# Altium footprint library USB Connectors WR-COM.PcbLib: 43 footprints (part 3 of 3)
Each footprint in its own frame and in the unit in brackets; x right, y up, seen from the top. Pads: shape width x height; smd on the part's side, far side on the other; paste and mask are expansions set on the pad; w line width, h text height; cw(c..) or ccw(c..) is an arc to the next point about the centre after c.
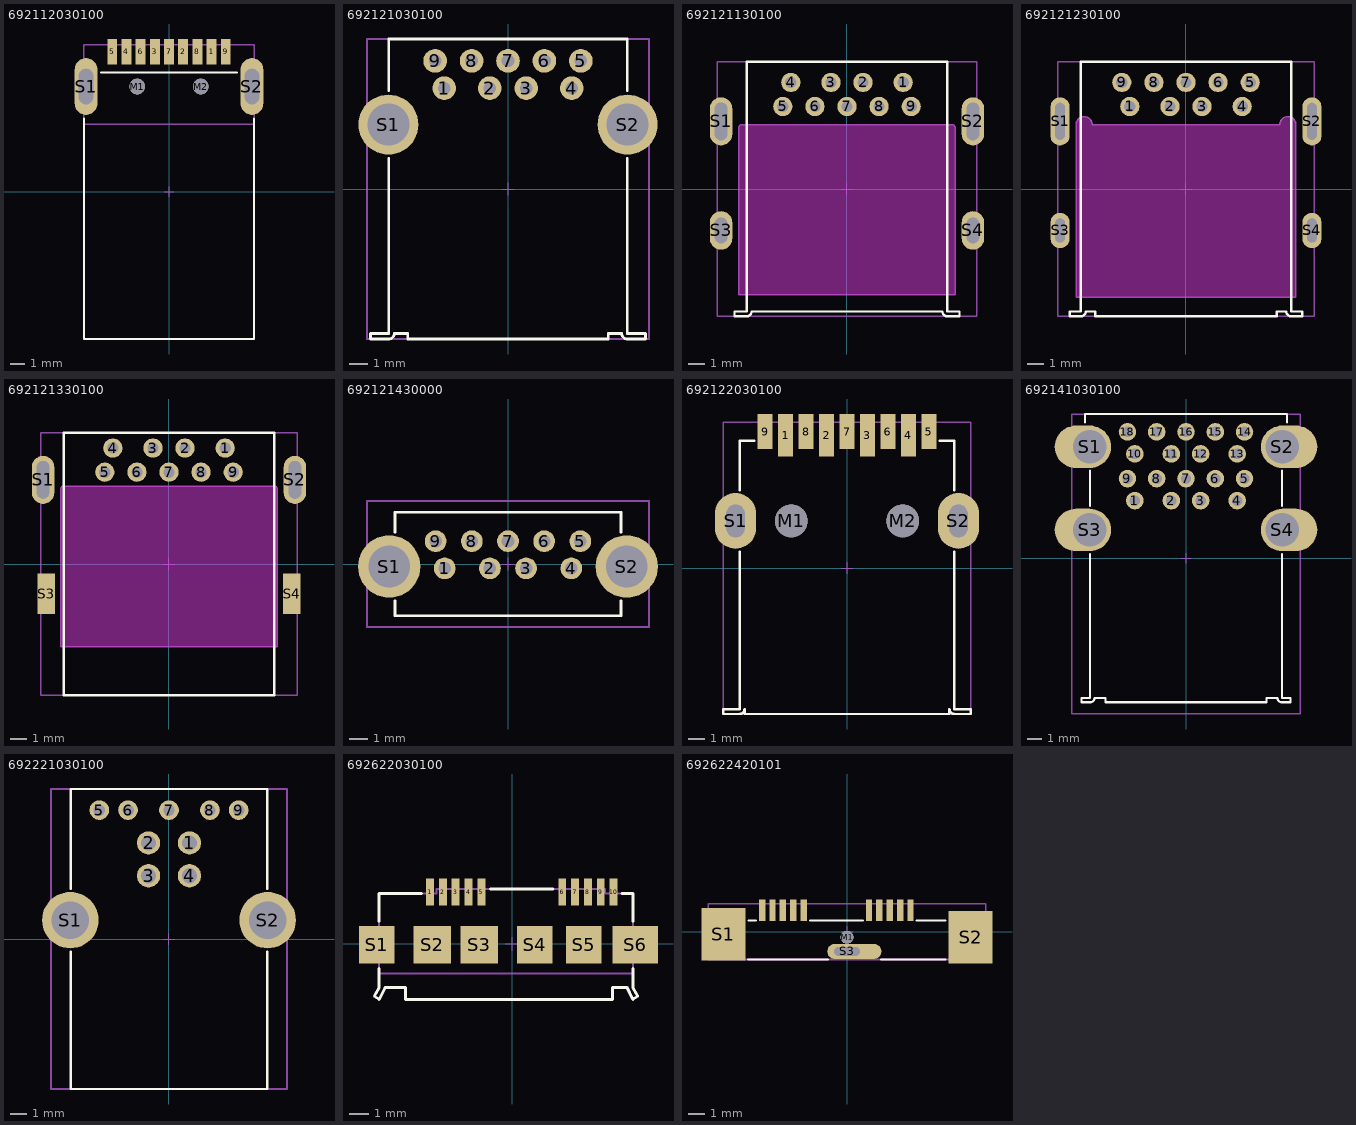
[diagram p2: the footprints below, top view; thin cyan lines are the x and y axes]

## 692112030100 [mm] "USB 3.0 Type A SMT Plug with Clip"
height 4.5
pads (13):
  rect 0.7x1.8 smd: 1(3,9.875) 2(1,9.875) 3(-1,9.875) 4(-3,9.875) 5(-4,9.875) 6(-2,9.875) 7(0,9.875) 8(2,9.875) 9(4,9.875)
  round 1.1 hole 1.1 unplated: M1(-2.25,7.425) M2(2.25,7.425)
  oval 1.6x4 hole 1 slot 2.5 at 90 deg: S1(-5.85,7.425) S2(5.85,7.425)
Top Overlay:
  lines w0.15: -6,5.15 -6,-10.375 6,-10.375 6,5.15 ; -4.8,8.425 4.8,8.425
Mechanical 1:
  lines w0.1: -6,4.775 6,4.775
  text "PCB Edge" at -2,3.725 h1
Mechanical 13:
  lines w0.1: -6,-10.375 6,-10.375 6,10.375 -6,10.375 -6,-10.375
Mechanical 15:
  lines w0.05: -0.35,0 0.35,0 ; 0,-0.35 0,0.35
3D body "692112030100.stp": height 1.85, standoff -2.65, extent -6,-10.375 6,10.375

## 692121030100 [mm] "USB 3.0 Type A Horizontal"
height 6.99
pads (11):
  round 1.3 hole 0.7: 1(-3.5,5.54) 2(-1,5.54) 3(1,5.54) 4(3.5,5.54) 5(4,7.04) 6(2,7.04) 7(0,7.04) 8(-2,7.04) 9(-4,7.04)
  round 3.3 hole 2.3: S1(-6.57,3.54) S2(6.57,3.54)
Top Overlay:
  lines w0.15: -6.55,1.69 -6.55,-7.94 -7.55,-7.94 -7.55,-8.24 -6.56,-8.24 ccw(c-6.55,-7.94) -6.25,-7.94 -5.5,-7.94 -5.5,-8.24 5.5,-8.24 5.5,-7.94 6.25,-7.94 ccw(c6.55,-7.94) 6.56,-8.24 7.55,-8.24 7.55,-7.94 6.55,-7.94 6.55,1.69 ; -6.55,5.39 -6.55,8.24 6.55,8.24 6.55,5.39
Mechanical 13:
  lines w0.1: -7.74,-8.24 7.74,-8.24 7.74,8.24 -7.74,8.24 -7.74,-8.24
Mechanical 15:
  lines w0.05: -0.35,0 0.35,0 ; 0,-0.35 0,0.35
3D body "692121030100.stp": height 8.02, standoff -3.2, extent -7.74,-8.24 7.74,8.31

## 692121130100 [mm] "USB 3.0 Type A Reverse Horizontal w. Offset 0.14mm"
height 5.12
pads (13):
  round 1.2 hole 0.7: 1(3.5,6.645) 2(1,6.645) 3(-1,6.645) 4(-3.5,6.645) 5(-4,5.145) 6(-2,5.145) 7(0,5.145) 8(2,5.145) 9(4,5.145)
  oval 1.4x3 hole 0.8 slot 2.35 at 90 deg: S1(-7.85,4.215) S2(7.85,4.215)
  oval 1.4x2.4 hole 0.8 slot 1.6 at 90 deg: S3(-7.85,-2.585) S4(7.85,-2.585)
Top Overlay:
  lines w0.15: -7.01,-7.935 -7.01,-7.635 -6.25,-7.635 -6.25,7.935 6.25,7.935 6.25,-7.635 7.01,-7.635 7.01,-7.935 6.26,-7.935 cw(c6.25,-7.635) 5.95,-7.635 -5.95,-7.635 cw(c-6.25,-7.635) -6.26,-7.935 -7.01,-7.935
Keep-Out Layer:
  board cut-out: -6.75,-6.585 6.75,-6.585 6.75,3.815 6.75,3.855 6.72,3.928 6.663,3.985 6.59,4.015 6.55,4.015 -6.55,4.015 -6.59,4.015 -6.663,3.985 -6.72,3.928 -6.75,3.855 -6.75,3.815
Mechanical 1:
  lines w0.1: -6.75,-6.585 -6.75,3.815 cw(c-6.55,3.815) -6.55,4.015 6.55,4.015 cw(c6.55,3.815) 6.75,3.815 6.75,-6.585 -6.75,-6.585
  text "PCB Cutout Area" at -5,-1.57 h1.5
Mechanical 13:
  lines w0.1: -8.078,-7.935 -8.078,7.935 8.078,7.935 8.078,-7.935 -8.078,-7.935
Mechanical 15:
  lines w0.05: -0.35,0 0.35,0 ; 0,-0.35 0,0.35
3D body "692121130100.stp": height 4.05, standoff -3.67, extent -8.078,-7.935 8.078,7.935

## 692121230100 [mm] "USB 3.0 Type A Horizontal with Offset 1.04mm"
height 3.9
pads (13):
  round 1.2 hole 0.7: 1(-3.5,5.145) 2(-1,5.145) 3(1,5.145) 4(3.5,5.145) 5(4,6.645) 6(2,6.645) 7(0,6.645) 8(-2,6.645) 9(-4,6.645)
  oval 1.2x3 hole 0.6 slot 2.3 at 90 deg: S1(-7.85,4.215) S2(7.85,4.215)
  oval 1.2x2.2 hole 0.6 slot 1.5 at 90 deg: S3(-7.85,-2.585) S4(7.85,-2.585)
Top Overlay:
  lines w0.15: -7.25,-7.935 -7.25,-7.635 -6.55,-7.635 -6.55,7.935 6.55,7.935 6.55,-7.635 7.25,-7.635 7.25,-7.935 6.56,-7.935 cw(c6.55,-7.635) 6.25,-7.635 5.65,-7.635 5.65,-7.935 -5.65,-7.935 -5.65,-7.635 -6.25,-7.635 cw(c-6.55,-7.635) -6.56,-7.935 -7.25,-7.935
Keep-Out Layer:
  board cut-out: -6.85,-6.755 6.85,-6.755 6.85,4.015 6.85,4.115 6.774,4.298 6.633,4.439 6.449,4.515 6.251,4.515 6.067,4.439 5.926,4.298 5.85,4.115 5.85,4.015 -5.85,4.015 -5.85,4.115 -5.926,4.298 -6.067,4.439 -6.251,4.515 -6.449,4.515 -6.633,4.439 -6.774,4.298 -6.85,4.115 -6.85,4.015
Mechanical 1:
  lines w0.1: -6.85,-6.755 -6.85,4.015 cw(c-6.35,4.015) -5.85,4.015 5.85,4.015 cw(c6.35,4.015) 6.85,4.015 6.85,-6.755 -6.85,-6.755
  text "PCB Cutout Area" at -4.7,-1.425 h1.5
Mechanical 13:
  lines w0.1: -8,-7.935 8,-7.935 8,7.935 -8,7.935 -8,-7.935
Mechanical 15:
  lines w0.05: -0.35,0 0.35,0 ; 0,-0.35 0,0.35
3D body "692121230100.stp": height 4.6, standoff -2.52, extent -8,-7.935 8,7.935

## 692121330100 [mm] "USB 3.0 Type A Reverse Horizontal with Offset 1.75mm"
height 7.4
pads (13):
  round 1.2 hole 0.7: 1(3.5,7.225) 2(1,7.225) 3(-1,7.225) 4(-3.5,7.225) 5(-4,5.725) 6(-2,5.725) 7(0,5.725) 8(2,5.725) 9(4,5.725)
  oval 1.4x3 hole 0.8 slot 2.35 at 90 deg: S1(-7.85,5.245) S2(7.85,5.245)
  rect 1.1x2.5 smd: S3(-7.65,-1.855) S4(7.65,-1.855)
Top Overlay:
  lines w0.15: -6.55,-8.185 -6.55,8.185 6.55,8.185 6.55,-8.185 -6.55,-8.185
Keep-Out Layer:
  board cut-out: -6.75,-5.155 -6.75,4.675 -6.75,4.709 -6.724,4.771 -6.676,4.819 -6.614,4.845 -6.58,4.845 6.58,4.845 6.614,4.845 6.676,4.819 6.724,4.771 6.75,4.709 6.75,4.675 6.75,-5.155
Mechanical 1:
  lines w0.1: -6.75,-5.155 6.75,-5.155 6.75,4.675 ccw(c6.58,4.675) 6.58,4.845 -6.58,4.845 ccw(c-6.58,4.675) -6.75,4.675 -6.75,-5.155
  text "PCB Cutout Area" at -4.75,-0.15 h1.5
Mechanical 13:
  lines w0.1: -8,-8.185 -8,8.185 8,8.185 8,-8.185 -8,-8.185
Mechanical 15:
  lines w0.05: -0.35,0 0.35,0 ; 0,-0.35 0,0.35
3D body "692121330100.stp": height 2.99, standoff -4.41, extent -8,-8.185 8,8.185

## 692121430000 [mm] "USB 3.0 Type A Vertical THT"
height 15
pads (11):
  round 1.2 hole 0.7: 1(-3.5,-0.235) 2(-1,-0.235) 3(1,-0.235) 4(3.5,-0.235) 5(4,1.265) 6(2,1.265) 7(0,1.265) 8(-2,1.265) 9(-4,1.265)
  round 3.45 hole 2.3: S1(-6.57,-0.135) S2(6.57,-0.135)
Top Overlay:
  lines w0.15: -6.25,-2.035 -6.25,-2.855 6.25,-2.855 6.25,-2.035 ; -6.25,1.765 -6.25,2.865 6.25,2.865 6.25,1.765
Mechanical 13:
  lines w0.1: -7.8,-3.475 7.8,-3.475 7.8,3.485 -7.8,3.485 -7.8,-3.475
Mechanical 15:
  lines w0.05: -0.35,0 0.35,0 ; 0,-0.35 0,0.35
3D body "692121430000.stp": height 15.1, standoff -3.67, extent -7.8,-3.475 7.8,3.475

## 692122030100 [mm] "USB 3.0 Type A Horizontal SMD"
height 6.99
pads (13):
  rect 0.9x2.6 smd: 1(-3.75,8.105) 2(-1.25,8.105) 3(1.25,8.105) 4(3.75,8.105)
  rect 0.9x2.15 smd: 5(5,8.33) 6(2.5,8.33) 7(0,8.33) 8(-2.5,8.33) 9(-5,8.33)
  round 2 hole 2 unplated: M1(-3.4,2.885) M2(3.4,2.885)
  oval 2.52x3.4 hole 1.12 slot 2 at 90 deg: S1(-6.8,2.885) S2(6.8,2.885)
Top Overlay:
  lines w0.15: -6.55,1.005 -6.55,-8.595 -7.55,-8.595 -7.55,-8.895 -6.56,-8.895 ccw(c-6.55,-8.595) -6.25,-8.595 -6.25,-8.895 6.25,-8.895 6.25,-8.595 ccw(c6.55,-8.595) 6.56,-8.895 7.55,-8.895 7.55,-8.595 6.55,-8.595 6.55,1.005 ; -6.55,4.765 -6.55,7.765 -5.65,7.765 ; 5.65,7.765 6.55,7.765 6.55,4.765
Mechanical 13:
  lines w0.1: -7.55,-8.895 7.55,-8.895 7.55,8.905 -7.55,8.905 -7.55,-8.895
Mechanical 15:
  lines w0.05: -0.35,0 0.35,0 ; 0,-0.35 0,0.35
3D body "692122030100.stp": height 7.96, standoff -2.28, extent -7.55,-8.895 7.55,8.905

## 692141030100 [mm] "USB 3.0 Type A Stacked"
height 15.42
pads (22):
  round 1.2 hole 0.7: 1(-3.5,3.93) 2(-1,3.93) 3(1,3.93) 4(3.5,3.93) 5(4,5.43) 6(2,5.43) 7(0,5.43) 8(-2,5.43) 9(-4,5.43) 10(-3.5,7.13) 11(-1,7.13) 12(1,7.13) 13(3.5,7.13) 14(4,8.63) 15(2,8.63) 16(0,8.63) 17(-2,8.63) 18(-4,8.63)
  oval 3.85x2.9 hole 2.3 copper offset -0.475,0: S1(-6.57,7.61) S3(-6.57,1.93)
  oval 3.85x2.9 hole 2.3 copper offset 0.475,0: S2(6.57,7.61) S4(6.57,1.93)
Top Overlay:
  lines w0.15: -6.9,9.26 -6.9,9.85 6.9,9.85 6.9,9.26 ; -6.55,0.28 -6.55,-9.55 -7.15,-9.55 -7.15,-9.85 -6.56,-9.85 ccw(c-6.55,-9.55) -6.25,-9.55 -5.5,-9.55 -5.5,-9.85 5.5,-9.85 5.5,-9.55 6.25,-9.55 ccw(c6.55,-9.55) 6.56,-9.85 7.15,-9.85 7.15,-9.55 6.55,-9.55 6.55,0.28 ; -6.55,3.58 -6.55,5.97 ; 6.55,3.58 6.55,5.97
Mechanical 13:
  lines w0.1: -7.795,-10.65 7.795,-10.65 7.795,9.85 -7.795,9.85 -7.795,-10.65
Mechanical 15:
  lines w0.05: -0.35,0 0.35,0 ; 0,-0.35 0,0.35
3D body "692141030100.stp": height 16.11, standoff -3.5, extent -7.794,-10.65 7.794,9.85

## 692221030100 [mm] "USB 3.0 Type B Horizontal"
height 12.9
pads (11):
  round 1.42 hole 0.92: 1(1.25,5.86) 2(-1.25,5.86) 3(-1.25,3.86) 4(1.25,3.86)
  round 1.2 hole 0.7: 5(-4.25,7.86) 6(-2.5,7.86) 7(0,7.86) 8(2.5,7.86) 9(4.25,7.86)
  round 3.45 hole 2.3: S1(-6.02,1.15) S2(6.02,1.15)
Top Overlay:
  lines w0.15: -6,-0.78 -6,-9.15 6,-9.15 6,-0.78 ; -6,3.07 -6,9.15 6,9.15 6,3.07
Mechanical 13:
  lines w0.1: -7.2,-9.15 -7.2,9.15 7.2,9.15 7.2,-9.15 -7.2,-9.15
Mechanical 15:
  lines w0.05: -0.35,0 0.35,0 ; 0,-0.35 0,0.35
3D body "692221030100.stp": height 12.95, standoff -3.18, extent -7.2,-9.15 7.2,9.15

## 692622030100 [mm] "Micro USB 3.0 Type B Horizontal SMT"
height 2.58
pads (16):
  rect 0.4x1.35 smd: 1(-4.17,2.63) 2(-3.52,2.63) 3(-2.87,2.63) 4(-2.22,2.63) 5(-1.57,2.63) 6(2.53,2.63) 7(3.18,2.63) 8(3.83,2.63) 9(4.48,2.63) 10(5.13,2.63)
  rect 1.8x1.9 smd: S1(-6.87,-0.045) S4(1.13,-0.045) S5(3.63,-0.045)
  rect 1.9x1.9 smd: S2(-4.07,-0.045) S3(-1.67,-0.045)
  rect 2.3x1.9 smd: S6(6.23,-0.045)
Top Overlay:
  lines w0.15: -6.745,-1.25 -6.745,-2.205 -6.995,-2.645 -6.745,-2.805 -6.445,-2.205 -5.405,-2.205 -5.405,-2.805 5.065,-2.805 5.065,-2.205 5.805,-2.205 6.105,-2.805 6.355,-2.645 6.105,-2.205 6.105,-1.25 ; -6.745,1.15 -6.745,2.545 -4.6,2.545 ; -1.1,2.795 2.05,2.795 ; 5.55,2.545 6.105,2.545 6.105,1.15
Mechanical 1:
  lines w0.1: -6.745,-1.495 6.105,-1.495
  text "PCB Edge" at -1.82,-2.308 h0.89
Mechanical 13:
  lines w0.1: -6.995,-2.645 -6.745,-2.205 -6.745,2.545 -3.85,2.545 -3.85,2.795 4.7,2.795 4.7,2.545 6.105,2.545 6.105,-2.205 6.355,-2.645 6.105,-2.805 5.805,-2.205 5.065,-2.205 5.065,-2.805 -5.405,-2.805 -5.405,-2.205 -6.445,-2.205 -6.745,-2.805 -6.995,-2.645
Mechanical 15:
  lines w0.05: -0.35,0 0.35,0 ; 0,-0.35 0,0.35
3D body "692622030100.stp": height 2.84, standoff -0.11, extent -6.87,-2.795 6.872,2.807

## 692622420101 [mm] "Micro USB 3.0 Type B Vertical SMT"
height 5.15
pads (14):
  rect 0.4x1.35 smd: 1(3.98,1.34) 2(3.33,1.34) 3(2.68,1.34) 4(2.03,1.34) 5(1.38,1.34) 6(-2.72,1.34) 7(-3.37,1.34) 8(-4.02,1.34) 9(-4.67,1.34) 10(-5.32,1.34)
  round 0.8 hole 0.8 unplated: M1(0,-0.35)
  rect 2.75x3.3 smd: S1(-7.75,-0.16) S2(7.75,-0.35)
  oval 3.4x0.95 hole 0.55 slot 1.6 at 0 deg copper offset 0.46,0: S3(0,-1.24)
Top Overlay:
  lines w0.15: -6.18,-1.75 -1.21,-1.75 ; -6.17,0.7 -5.72,0.7 ; -2.32,0.7 0.98,0.7 ; 2.13,-1.75 6.17,-1.75 ; 4.37,0.7 6.17,0.7
Mechanical 13:
  lines w0.1: -8.7,-1.75 8.7,-1.75 8.7,1.75 -8.7,1.75 -8.7,-1.75
Mechanical 15:
  lines w0.05: -0.35,0 0.35,0 ; 0,-0.35 0,0.35
3D body "692622420101.stp": height 5.82, standoff -0.83, extent -8.7,-1.75 8.7,1.75